# Altium footprint library JL_PCB.PCBLIB: 1129 footprints (part 62 of 72)
Each footprint in its own frame and in the unit in brackets; x right, y up, seen from the top. Pads: shape width x height; smd on the part's side, far side on the other; paste and mask are expansions set on the pad; w line width, h text height; cw(c..) or ccw(c..) is an arc to the next point about the centre after c.
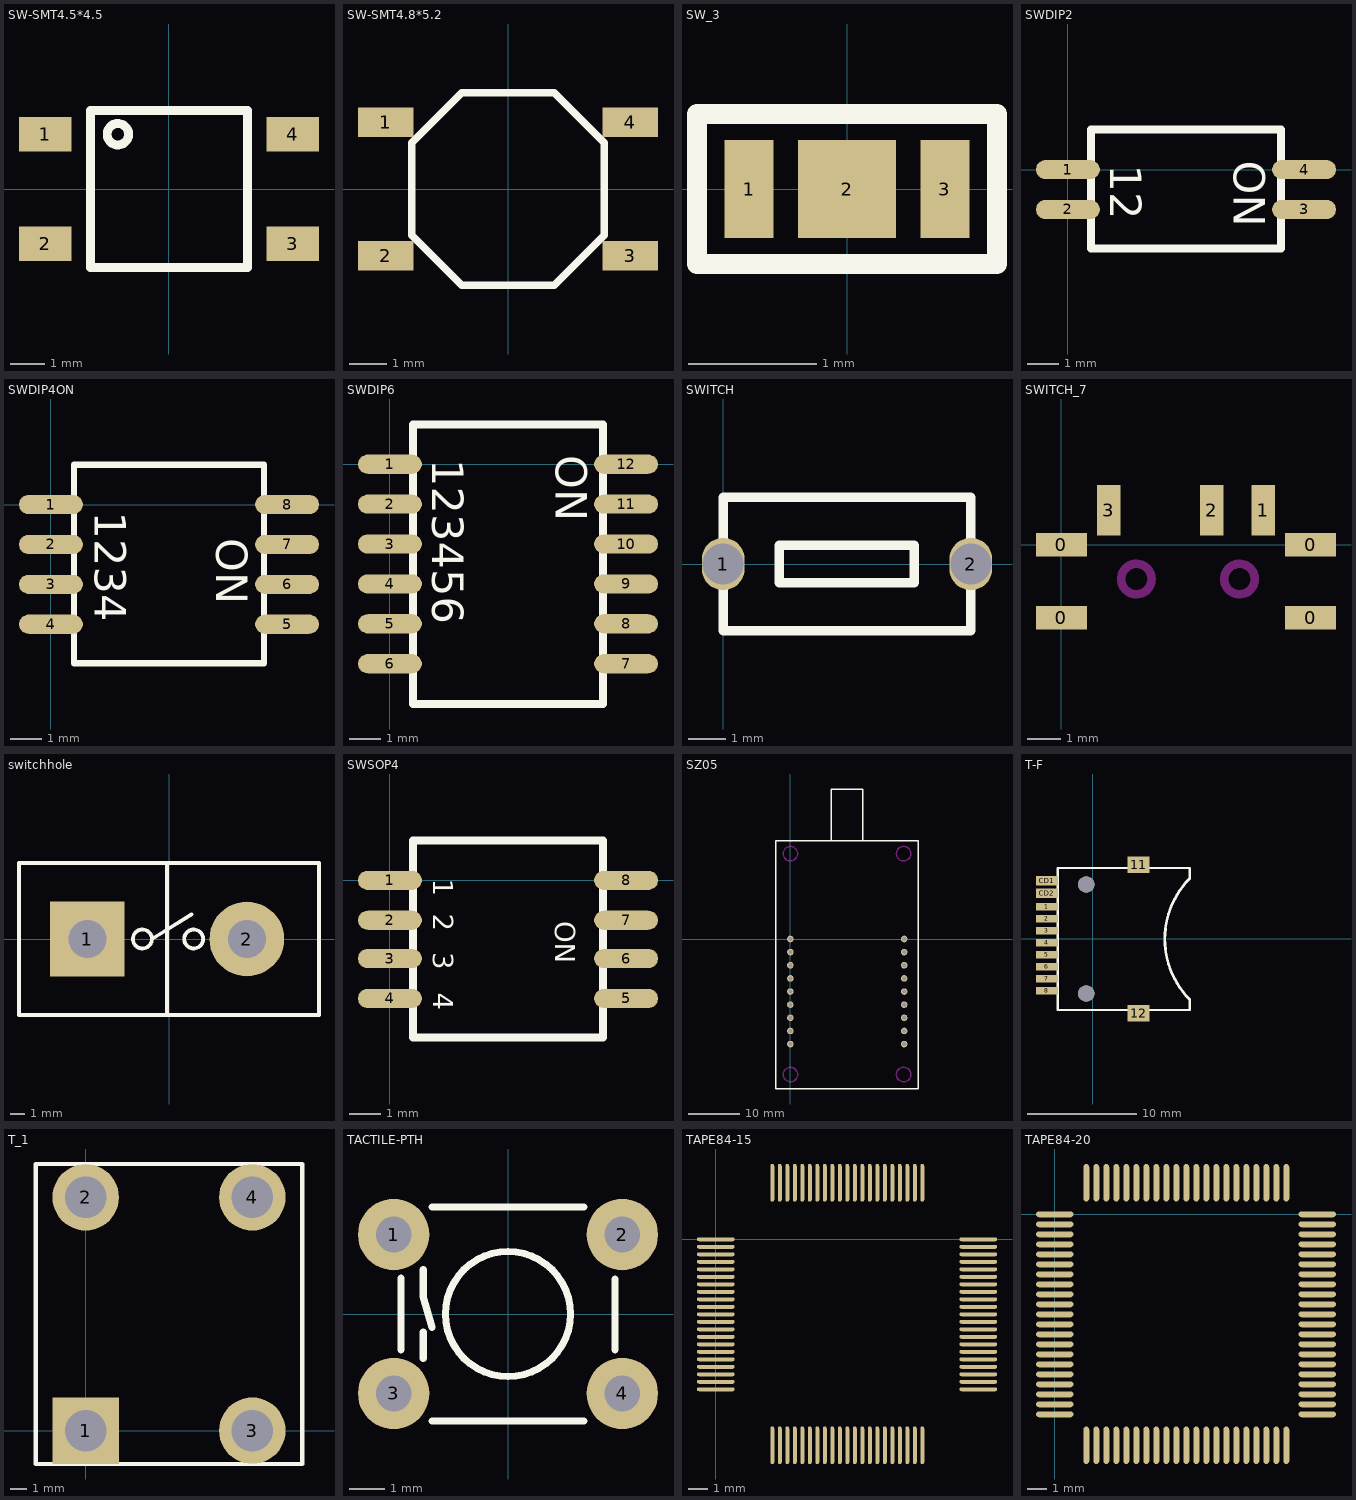
[diagram p61: the footprints below, top view; thin cyan lines are the x and y axes]

## SW-SMT4.5*4.5 [mm]
pads (4):
  rect 1.5x1 smd: 1(-3.55,1.57) 2(-3.55,-1.57) 3(3.55,-1.57) 4(3.55,1.57)
TopOverlay:
  circle w0.254: c-1.465,1.57 r0.307
  lines w0.254: -2.25,-2.25 -2.25,2.25 2.25,2.25 2.25,-2.25 -2.25,-2.25
3D body "PUSH BUTTON-3.STEP": height 7.49, standoff 0.02, extent -4.066,-2.235 3.934,2.265

## SW-SMT4.8*5.2 [mm]
pads (4):
  rect 1.5x0.8 smd: 1(-3.3,1.8) 2(-3.3,-1.8) 3(3.3,-1.8) 4(3.3,1.8)
TopOverlay:
  lines w0.203: -2.6,1.254 -1.254,2.6 ; -2.6,-1.25 -1.25,-2.6 1.25,-2.6 2.6,-1.25 2.6,1.25 1.25,2.6 -1.25,2.6 -2.6,1.25 -2.6,-1.25

## SW_3 [mil]
pads (3):
  rect 15x30 smd: 1(-30,0) 3(30,0)
  rect 30x30 smd: 2(0,0)
TopOverlay:
  lines w6: -46,-23 -46,23 ; -45,-23 46,-23 46,23 -45,23

## SWDIP2 [mil]
pads (4):
  oval 80x24 smd: 1(0,0) 2(0,-50) 3(296,-50) 4(296,0)
TopOverlay:
  lines w10: 29,-99 29,50 267,50 267,-99 29,-99
  text "12" at 53,6 h39.37
  text "ON" at 208,11 h39.37

## SWDIP4ON [mil]
pads (8):
  oval 80x24 smd: 1(0,0) 2(0,-50) 3(0,-100) 4(0,-150) 5(296,-150) 6(296,-100) 7(296,-50) 8(296,0)
TopOverlay:
  lines w7.87: 29,-199 267,-199 267,50 29,50 29,-199
  text "1234" at 55,-9 h39.37
  text "ON" at 207,-42 h39.37

## SWDIP6 [mil]
pads (12):
  oval 80x24 smd: 1(0,0) 2(0,-50) 3(0,-100) 4(0,-150) 5(0,-200) 6(0,-250) 7(296,-250) 8(296,-200) 9(296,-150) 10(296,-100) 11(296,-50) 12(296,0)
TopOverlay:
  lines w10: 29,-99 29,50 ; 267,-99 267,50 ; 29,50 267,50 ; 29,50 29,-300.46 267,-300.46 267,50
  text "123456" at 53,6 h39.37
  text "ON" at 208,11 h39.37

## SWITCH [mil]
pads (2):
  oval 45x55 hole 43: 1(0,0) 2(260,0)
TopOverlay:
  lines w10: 0,-70 260,-70 260,70 0,70 0,0 0,-70 ; 59.05,-19.68 200.79,-19.68 200.79,19.68 59.05,19.68 59.05,-19.68

## SWITCH_7 [mm]
pads (7):
  rect 1.5x0.7 smd: 0(0,-2.159) 0(0,0) 0(7.366,-2.159) 0(7.366,0)
  rect 0.7x1.5 smd: 1(5.969,1.016) 2(4.445,1.016) 3(1.397,1.016)
KeepOutLayer:
  circle w0.254: c2.217,-1.016 r0.45
  circle w0.254: c5.265,-1.016 r0.45

## switchhole [mm]
pads (2):
  rect 5x5 hole 2.54: 1(-5.461,0)
  round 5 hole 2.54: 2(5.207,0)
TopOverlay:
  circle w0.254: c-1.778,0 r0.635
  circle w0.254: c1.651,0 r0.635
  lines w0.254: -1.143,0 1.524,1.651 ; -0.127,-5.08 -0.127,5.08 ; -10.033,-5.08 10.033,-5.08 10.033,5.08 -10.033,5.08 -10.033,-5.08

## SWSOP4 [mil]
pads (8):
  oval 80x24 smd: 1(0,0) 2(0,-50) 3(0,-98) 4(0,-148) 5(296,-148) 6(296,-98) 7(296,-50) 8(296,0)
TopOverlay:
  lines w10: 29,-197 267,-197 267,50 29,50 29,-197
  text "4" at 54,-141 h25
  text "3" at 54,-90 h25
  text "ON" at 207,-51 h25
  text "1" at 54,2 h25
  text "2" at 54,-42 h25

## SZ05 [mil]
pads (18):
  round 50 hole 32: 1(0,0) 2(0,-100) 3(0,-200) 4(0,-300) 5(0,-400) 6(0,-500) 7(0,-600) 8(0,-700) 9(0,-800) 10(866.14,-800) 11(866.14,-700) 12(866.14,-600) 13(866.14,-500) 14(866.14,-400) 15(866.14,-300) 16(866.14,-200) 17(866.14,-100) 18(866.14,0)
TopOverlay:
  lines w10: 312.99,748.03 312.99,1141.73 549.21,1141.73 549.21,748.03 ; -110.24,-1141.73 -110.24,748.03 972.44,748.03 972.44,-1141.73 -110.24,-1141.73
KeepOutLayer:
  circle w10: c862.2,649.61 r55.12
  circle w10: c0,649.61 r55.12
  circle w10: c0,-1031.5 r55.12
  circle w10: c862.2,-1031.5 r55.12

## T-F [mm]
pads (14):
  rect 2x0.7 smd: 1(-4.207,2.947) 2(-4.207,1.847) 3(-4.207,0.747) 4(-4.207,-0.353) 5(-4.207,-1.453) 6(-4.207,-2.553) 7(-4.207,-3.653) 8(-4.207,-4.753)
  rect 2x1.5 smd: 11(4.193,6.817) 12(4.193,-6.823)
  rect 2x0.85 smd: CD1(-4.207,5.347) CD2(-4.207,4.197)
  round 1.5 hole 1.5 unplated: ""(-0.607,-5.003)
  round 1.5 hole 1.5: ""(-0.607,4.997)
TopOverlay:
  lines w0.2: 8.893,-5.553 8.893,-6.518 -3.207,-6.518 -3.207,6.512 8.893,6.512 8.893,5.547
  lines w0.254: 8.893,-5.553 cw(c14.443,-0.003) 8.893,5.547

## T_1 [mm]
pads (4):
  rect 4x4 hole 2.5: 1(0,0)
  round 4 hole 2.5: 2(0,14) 3(10,0) 4(10,14)
TopOverlay:
  lines w0.254: -3,-2 -3,16 13,16 13,-2 -3,-2

## TACTILE-PTH [mil] "ֱ"
pads (4):
  round 80 hole 40: 1(-128,89) 2(128,89) 3(-128,-89) 4(128,-89)
TopOverlay:
  circle w8: c0,0 r70
  lines w8: -120,-40 -120,40.47 ; -95,-50 -95,-20 ; -95,50 -95,20 -85,-15 ; -85,-120 85,-120 ; -85,120 85,120 ; 120,-40 120,39.29
3D body "User Library-Panasonic-EVQPA-Pushbutton.STEP": height 212.6, standoff -118.11, extent -161.65,-118.11 161.65,118.11

## TAPE84-15 [mil]
pads (84):
  oval 75x8 smd: 1(0,0) 2(0,-15) 3(0,-30) 4(0,-45) 5(0,-60) 6(0,-75) 7(0,-90) 8(0,-105) 9(0,-120) 10(0,-135) 11(0,-150) 12(0,-165) 13(0,-180) 14(0,-195) 15(0,-210) 16(0,-225) 17(0,-240) 18(0,-255) 19(0,-270) 20(0,-285) 21(0,-300) 43(525,-300) 44(525,-285) 45(525,-270) 46(525,-255) 47(525,-240) 48(525,-225) 49(525,-210) 50(525,-195) 51(525,-180) 52(525,-165) 53(525,-150) 54(525,-135) 55(525,-120) 56(525,-105) 57(525,-90) 58(525,-75) 59(525,-60) 60(525,-45) 61(525,-30) 62(525,-15) 63(525,0)
  oval 8x75 smd: 22(113,-412) 23(128,-412) 24(143,-412) 25(158,-412) 26(173,-412) 27(188,-412) 28(203,-412) 29(218,-412) 30(233,-412) 31(248,-412) 32(263,-412) 33(278,-412) 34(293,-412) 35(308,-412) 36(323,-412) 37(338,-412) 38(353,-412) 39(368,-412) 40(383,-412) 41(398,-412) 42(413,-412) 64(413,113) 65(398,113) 66(383,113) 67(368,113) 68(353,113) 69(338,113) 70(323,113) 71(308,113) 72(293,113) 73(278,113) 74(263,113) 75(248,113) 76(233,113) 77(218,113) 78(203,113) 79(188,113) 80(173,113) 81(158,113) 82(143,113) 83(128,113) 84(113,113)

## TAPE84-20 [mil]
pads (84):
  oval 75x12 smd: 1(0,0) 2(0,-20) 3(0,-40) 4(0,-60) 5(0,-80) 6(0,-100) 7(0,-120) 8(0,-140) 9(0,-160) 10(0,-180) 11(0,-200) 12(0,-220) 13(0,-240) 14(0,-260) 15(0,-280) 16(0,-300) 17(0,-320) 18(0,-340) 19(0,-360) 20(0,-380) 21(0,-400) 43(525,-400) 44(525,-380) 45(525,-360) 46(525,-340) 47(525,-320) 48(525,-300) 49(525,-280) 50(525,-260) 51(525,-240) 52(525,-220) 53(525,-200) 54(525,-180) 55(525,-160) 56(525,-140) 57(525,-120) 58(525,-100) 59(525,-80) 60(525,-60) 61(525,-40) 62(525,-20) 63(525,0)
  oval 12x75 smd: 22(63,-462) 23(83,-462) 24(103,-462) 25(123,-462) 26(143,-462) 27(163,-462) 28(183,-462) 29(203,-462) 30(223,-462) 31(243,-462) 32(263,-462) 33(283,-462) 34(303,-462) 35(323,-462) 36(343,-462) 37(363,-462) 38(383,-462) 39(403,-462) 40(423,-462) 41(443,-462) 42(463,-462) 64(463,63) 65(443,63) 66(423,63) 67(403,63) 68(383,63) 69(363,63) 70(343,63) 71(323,63) 72(303,63) 73(283,63) 74(263,63) 75(243,63) 76(223,63) 77(203,63) 78(183,63) 79(163,63) 80(143,63) 81(123,63) 82(103,63) 83(83,63) 84(63,63)